# Altium footprint library 二极管封装库.PcbLib: 222 footprints (part 13 of 14)
Each footprint in its own frame and in the unit in brackets; x right, y up, seen from the top. Pads: shape width x height; smd on the part's side, far side on the other; paste and mask are expansions set on the pad; w line width, h text height; cw(c..) or ccw(c..) is an arc to the next point about the centre after c.
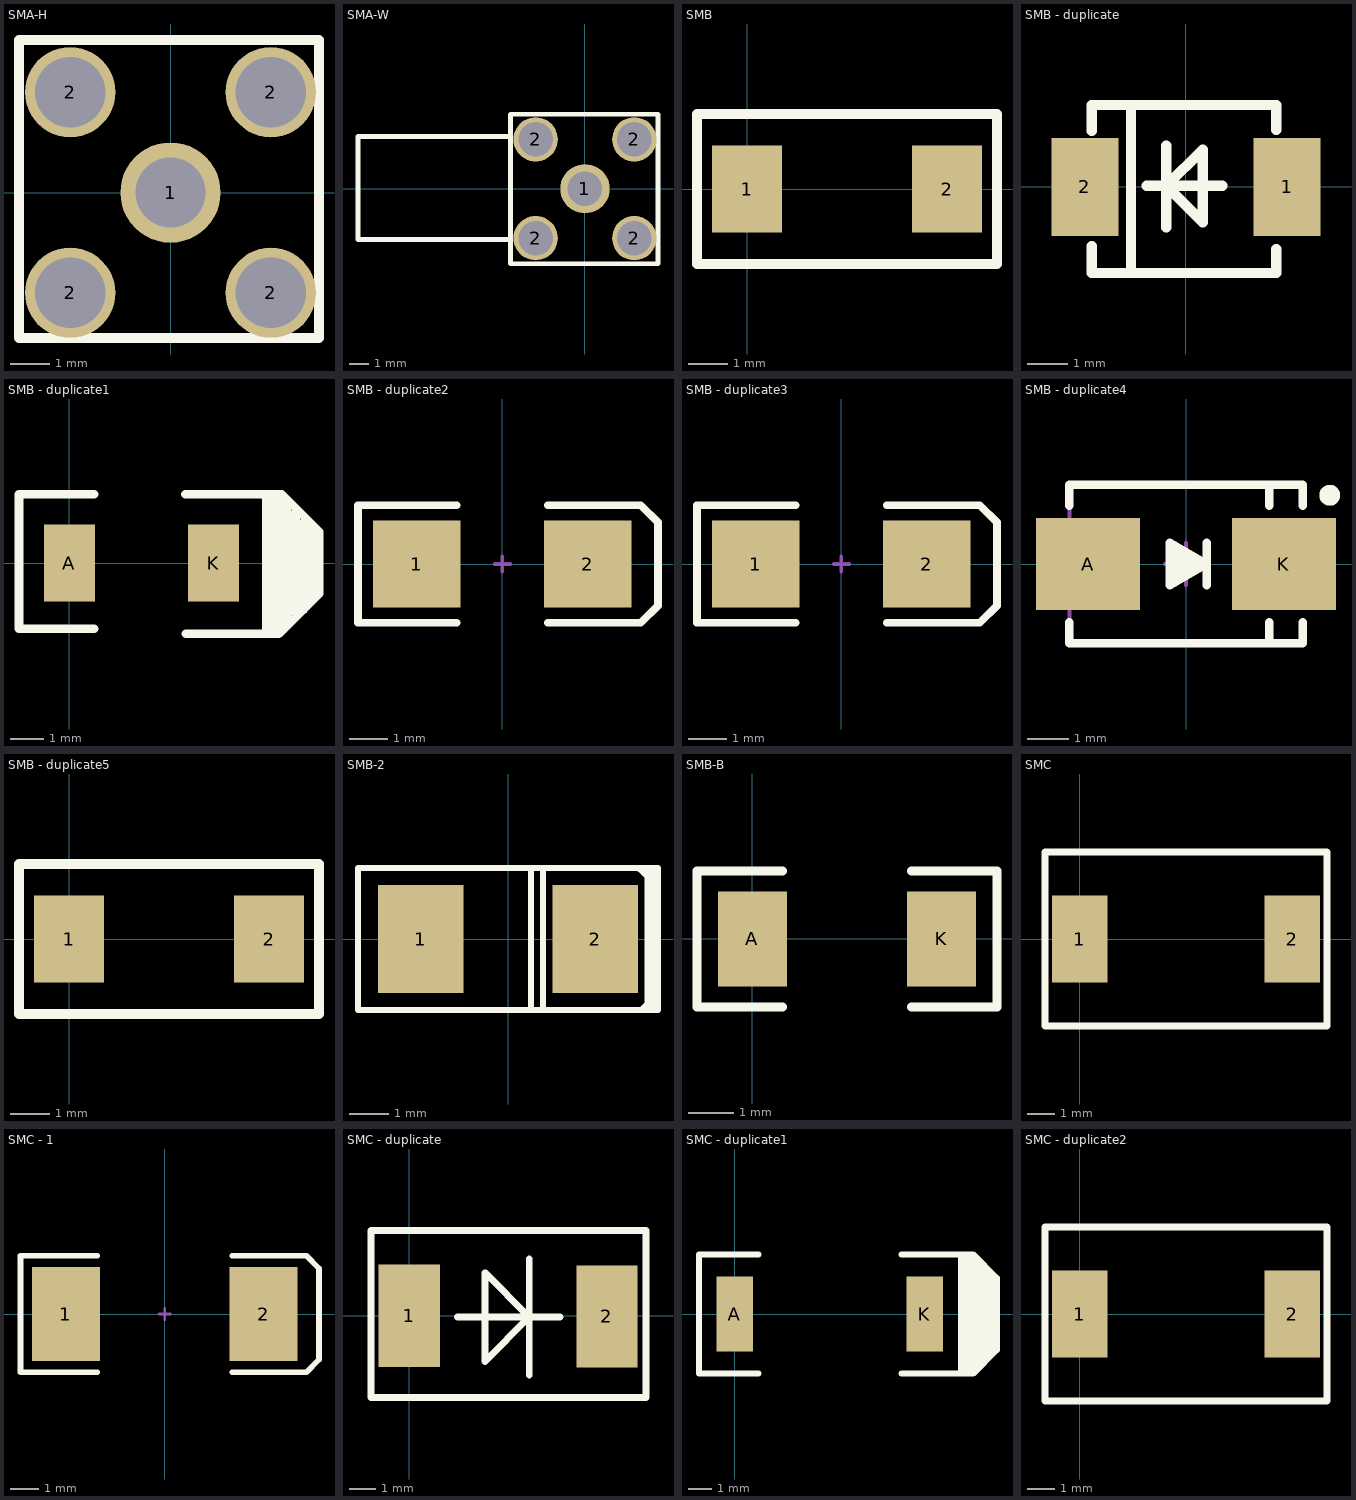
[diagram p12: the footprints below, top view; thin cyan lines are the x and y axes]

## SMA-H [mil]
pads (5):
  round 100 hole 70: 1(0,0)
  round 90 hole 70: 2(-100,-100) 2(-100,100) 2(100,-100) 2(100,100)
Top Overlay:
  lines w10: -151,-145 -151,152 148,152 148,-145 -151,-145
3D body "SMA-H.stp": height 105.71, standoff -430.31, extent -124.21,-124.2 124.21,124.22

## SMA-W [mil]
pads (5):
  round 100 hole 70: 1(0,0)
  round 90 hole 70: 2(-100,-100) 2(-100,100) 2(100,-100) 2(100,100)
Top Overlay:
  lines w10: -152,-103 -460,-103 -460,106 -151,106 ; -151,-152 148,-152 148,151 -151,151 -151,-152
3D body "Samtec-SMA-J-P-H-RA-TH1.step": height 108.06, standoff -447.24, extent -459.69,-139.8 134.8,135.79

## SMB [mil]
pads (2):
  rect 70x87.01 smd: 1(0,0) 2(200,0)
Top Overlay:
  lines w10: -50,-75 250,-75 250,75 -50,75 -50,-75
3D body "DO-214AA.STEP": height 98.43, standoff 0, extent -10.23,-76.76 210.24,76.78

## SMB - duplicate [mm] "DO-214AA"
pads (2):
  rect 1.65x2.4 smd: 1(2.475,0) 2(-2.475,0)
Top Overlay:
  lines w0.254: -2.311,-1.448 -2.311,-2.108 2.21,-2.108 2.21,-1.524 ; -2.311,1.372 -2.311,2.007 2.21,2.007 2.21,1.397 ; -1.346,-2.032 -1.346,2.007 ; -0.965,0.025 0.889,0.025 ; -0.483,-0.991 -0.483,1.016 ; -0.483,0.025 0.406,0.914 0.406,-0.864 -0.483,0.025
3D body "DI-214AA(SMB).step": height 2.45, standoff 0.03, extent -2.75,-1.975 2.75,1.925

## SMB - duplicate1 [mm]
pads (2):
  rect 1.52x2.3 smd: A(0,0) K(4.3,0)
Top Overlay:
  rectangle: 7.041,0.737 7.366,1.016
  rectangle: 7.191,0.737 7.214,1.191
  rectangle: 7.041,0.737 7.214,1.341
  rectangle: 6.833,-1.092 7.442,0.94
  rectangle: 6.756,-1.482 7.083,1.299
  rectangle: 6.528,-1.565 6.791,1.575
  rectangle: 6.756,-1.482 6.875,1.626
  rectangle: 6.492,-1.864 6.601,1.781
  rectangle: 6.376,-1.864 6.492,1.956
  rectangle: 6.248,-1.981 6.376,1.956
  rectangle: 5.867,-2.108 6.248,1.956
  lines w0.254: 0.744,-1.956 -1.499,-1.956 -1.499,2.057 0.749,2.057 ; 3.457,2.057 5.766,2.057 ; 3.475,-2.108 5.867,-2.108 ; 5.766,2.057 6.325,2.057 7.366,1.016 7.442,0.94 7.442,-0.914 6.248,-2.108 5.867,-2.108 ; 5.766,2.057 5.867,1.956 5.867,-2.108

## SMB - duplicate2 [mm] "DO-214-AA/SMB; 2 C-Bend Leads; Body 5.3 x 3.6 mm, inc. leads (LxW)"
height 2.54
pads (2):
  rect 2.3x2.3 smd: 1(-2.25,0) 2(2.25,0)
Top Overlay:
  lines w0.2: -1.2,-1.55 -3.8,-1.55 -3.8,1.55 -1.2,1.55 ; 1.2,-1.55 3.65,-1.55 4.1,-1.1 4.1,1.1 3.65,1.55 1.2,1.55
Mechanical 1:
  lines w0.1: -0.2,0 0.2,0 ; 0,-0.2 0,0.2

## SMB - duplicate3 [mm] "DO-214-AA/SMB; 2 C-Bend Leads; Body 5.3 x 3.6 mm, inc. leads (LxW)"
height 2.54
pads (2):
  rect 2.3x2.3 smd: 1(-2.25,0) 2(2.25,0)
Top Overlay:
  lines w0.2: -1.2,-1.55 -3.8,-1.55 -3.8,1.55 -1.2,1.55 ; 1.2,-1.55 3.65,-1.55 4.1,-1.1 4.1,1.1 3.65,1.55 1.2,1.55
Mechanical 1:
  lines w0.1: -0.2,0 0.2,0 ; 0,-0.2 0,0.2

## SMB - duplicate4 [mm] "4.7*3.9*2.2mm(长宽高，不包括引脚）"
height 2.4
pads (2):
  rect 2.5x2.2 smd: A(-2.35,0) K(2.35,0)
Top Overlay:
  circle w0.25: c3.45,1.65 r0.125
  lines w0.2: -2.8,-1.4 -2.8,-1.9 2.8,-1.9 2.8,-1.4 ; -2.8,1.4 -2.8,1.9 2.8,1.9 2.8,1.4 ; 2,-1.9 2,-1.4 ; 2,1.4 2,1.9
  lines w0.203: 0.5,-0.508 0.5,0.508 ; -0.389,-0.508 0.5,0 -0.389,0.508 -0.389,-0.508
  lines w0.254: -0.254,0 0.279,0 ; 0.279,0 -0.229,-0.305 -0.229,0.279 0.279,0
Mechanical 13:
  lines w0.1: 2.8,-1.9 -2.8,-1.9 -2.8,1.9 2.8,1.9
Mechanical 15:
  lines w0.1: -0.5,0 0.5,0 ; 0,-0.5 0,0.5
3D body "SMB.STEP": height 2.35, standoff 0.04, extent -2.629,-1.8 2.675,1.8

## SMB - duplicate5 [mil]
pads (2):
  rect 70x87.01 smd: 1(0,0) 2(200,0)
Top Overlay:
  lines w10: -50,-75 -50,75 250,75 250,-75 -50,-75
3D body "DO-214AA.STEP": height 98.43, standoff 0, extent -10.23,-76.76 210.24,76.78

## SMB-2 [mil]
pads (2):
  rect 85x107.99 smd: 1(-87.01,0) 2(87.01,0)
Top Overlay:
  rectangle: 139.02,-69.72 147.95,58.58
  rectangle: 144.25,57.32 147.95,60.91
  rectangle: 140.59,59.72 148.23,69.13
  lines w5.91: 22.99,-69.49 22.99,68.74 ; 34.8,-67.91 34.8,70.31 ; 131.85,69.29 148.35,52.8 ; 132.91,-70.87 149.61,-54.17 ; 139.02,-69.57 139.02,70.59 ; -149.61,-70.87 -149.61,70.87 149.61,70.87 149.61,-70.87 -149.61,-70.87

## SMB-B [mil]
pads (2):
  rect 60x82 smd: A(0,0) K(164,0)
Top Overlay:
  lines w8: 26,-59 -48,-59 -48,59 26,59 ; 138,-59 212,-59 212,59 138,59

## SMC [mil]
pads (2):
  rect 80x125.2 smd: 1(0,0) 2(305,0)
Top Overlay:
  lines w10: -50,-125 -50,125 355,125 355,-125 -50,-125
3D body "DO-214AB.STEP": height 106.3, standoff 0, extent -4.84,-122.04 314.85,122.05

## SMC - 1 [mm] "DO-214-AB/SMC; 2 C-Bend Leads; Body 7.9 x 5.9 mm, inc. leads (LxW)"
height 2.57
pads (2):
  rect 2.4x3.3 smd: 1(-3.475,0) 2(3.475,0)
Top Overlay:
  lines w0.2: -2.375,-2.05 -5.075,-2.05 -5.075,2.05 -2.375,2.05 ; 2.375,-2.05 4.975,-2.05 5.425,-1.6 5.425,1.6 4.975,2.055 ; 2.375,2.05 4.975,2.05
Mechanical 1:
  lines w0.1: -0.2,0 0.2,0 ; 0,-0.2 0,0.2

## SMC - duplicate [mil] "DO-214AB(2114)"
pads (2):
  rect 90x149.84 smd: 1(0,0)
  rect 90x149.63 smd: 2(290,-1)
Top Overlay:
  lines w10: 71,-2 221,-2 ; 176,-87 176,83 ; -56,-120 -56,125 347,125 347,-120 -56,-120 ; 111,-67 176,-2 111,63 111,-67
3D body "DO-214AB.STEP": height 106.3, standoff 0, extent -14.84,-117.09 304.84,127

## SMC - duplicate1 [mm]
pads (2):
  rect 1.55x3.2 smd: A(0,0) K(8.1,0)
Top Overlay:
  rectangle: 10.033,2.286 10.332,2.368
  rectangle: 10.344,1.975 10.552,2.148
  rectangle: 10.668,1.685 10.937,1.763
  rectangle: 10.611,1.708 10.798,1.902
  rectangle: 10.668,1.27 11.015,1.685
  rectangle: 10.541,-1.905 10.795,-1.397
  rectangle: 10.287,1.27 10.668,2.032
  rectangle: 9.906,-2.286 10.541,-1.397
  rectangle: 10.033,1.397 10.414,2.286
  rectangle: 10.16,-1.524 11.176,1.524
  rectangle: 9.652,-2.54 10.16,2.54
  lines w0.254: 1.016,-2.54 -1.524,-2.54 -1.524,2.54 1.016,2.54 ; 7.112,-2.54 9.652,-2.54 ; 7.112,2.54 9.652,2.54 ; 10.033,2.286 10.922,1.397 ; 10.922,-1.524 10.16,-2.286 10.16,-2.54 ; 9.652,-2.54 10.16,-2.54 ; 9.652,-2.54 9.652,2.54 ; 9.652,2.54 10.16,2.54 ; 10.16,-2.54 11.176,-1.524 11.176,1.524 ; 10.16,2.54 11.176,1.524 ; 10.16,2.54 11.176,1.524

## SMC - duplicate2 [mil]
pads (2):
  rect 80x125.2 smd: 1(0,0) 2(305,0)
Top Overlay:
  lines w10: -50,-125 -50,125 355,125 355,-125 -50,-125
3D body "DO-214AB.STEP": height 106.3, standoff 0, extent -4.84,-122.04 314.85,122.05